# Altium schematic symbol library TI Amplifiers and Linear Special Function Amplifier.SchLib: 708 symbols (part 11 of 34)
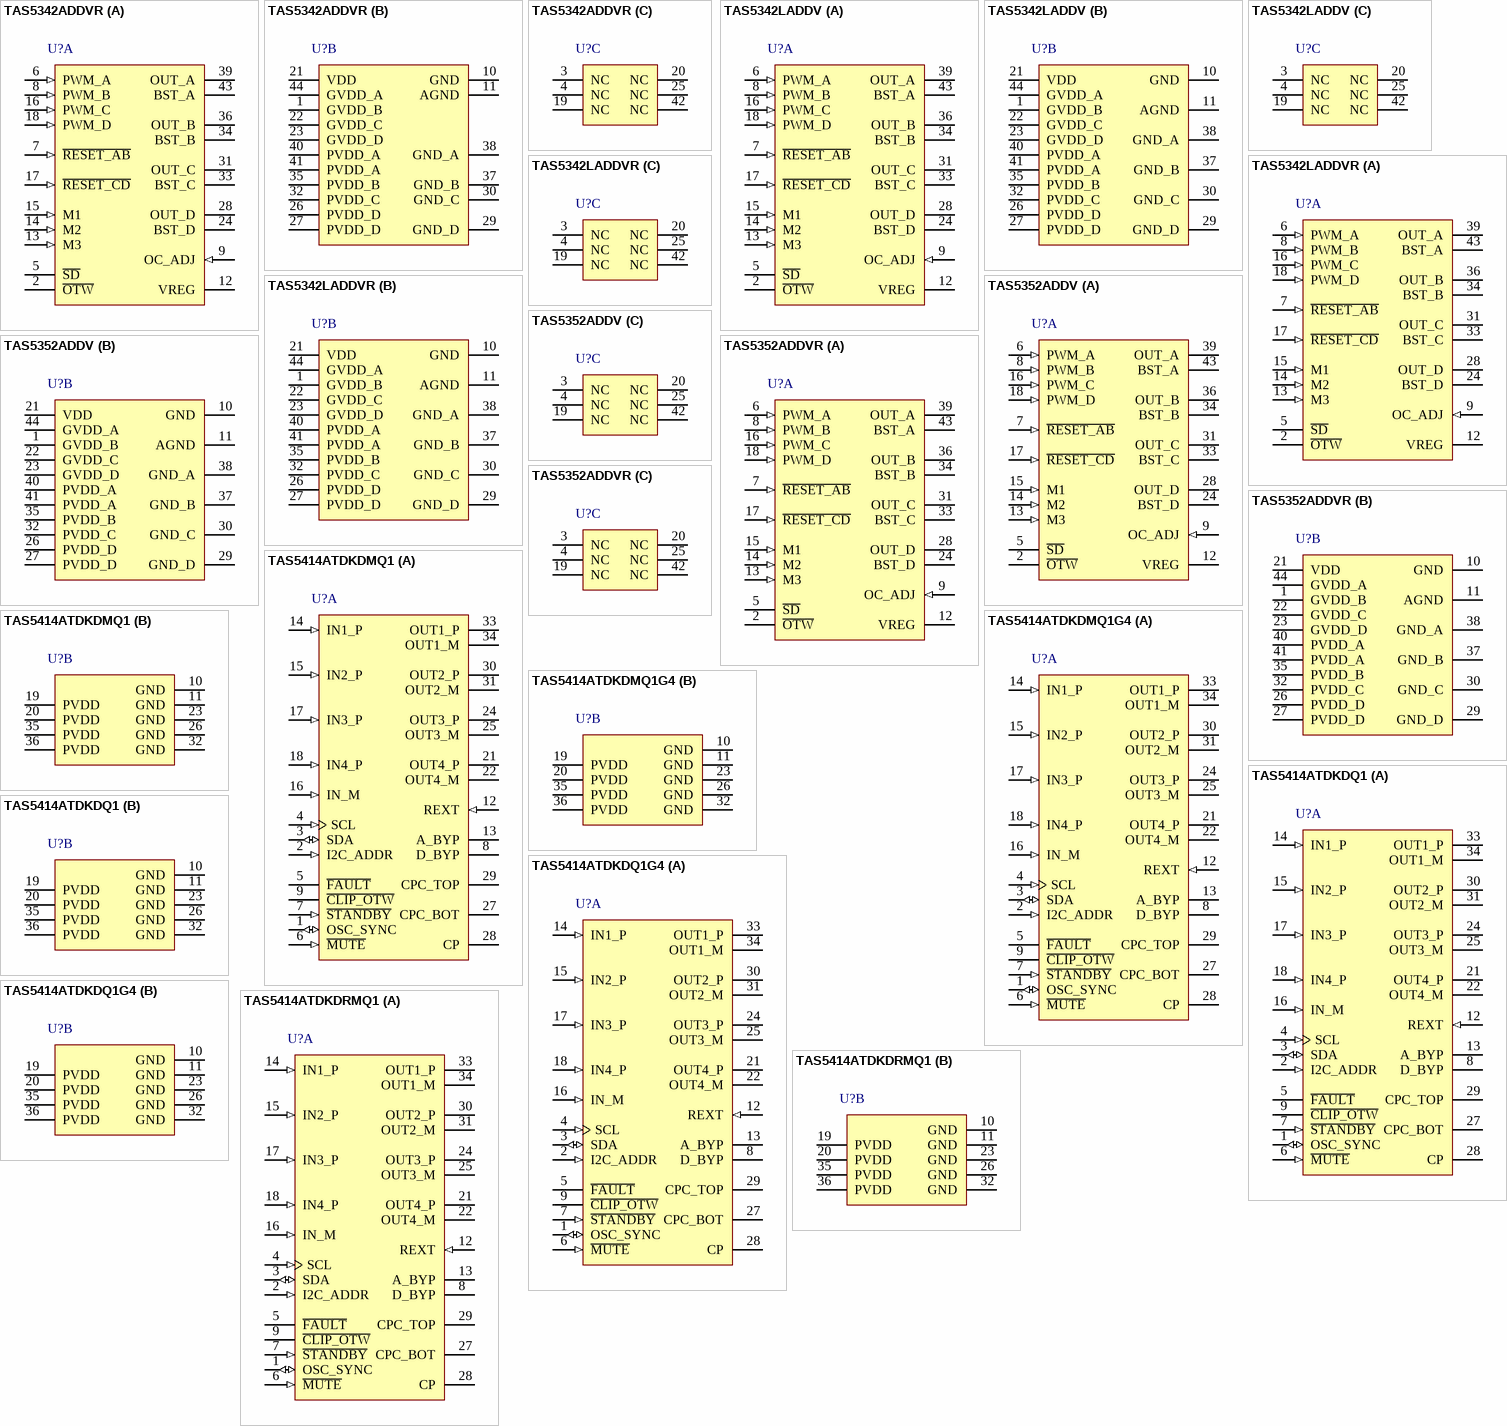
[diagram p49: symbols TAS5342ADDVR to TAS5414ATDKDRMQ1]

## TAS5414ATDKDMQ1
designator U?
4-Channel Automotive Digital Amplifier, -40 to 105 degC, 36-pin SOP (DKD36), Green (RoHS & no Sb/Br); Manufacturer: Texas Instruments; PartNumber: TAS5414ATDKDMQ1; Analog Supply Max [V]: 26.5; Analog Supply Min [V]: 6; Input Type: Analog; Max. Number of Speaker Outputs: 4; SubFamily: Mid/High-Power Amplifier; DatasheetVersion: SLOS535C; PackageVersion: 4204421-2/K, 06/2012; PackageReference: DKD36; PackageDescription: 36-Pin Plastic Small Outline, Body 15.9 x 11 mm, Pitch 0.65 mm; Supplier 1: Digi-Key; Supplier Part Number 1: 296-22042-5-ND; Supplier 2: Newark; Supplier Part Number 2: 52M6048; Supplier 3: Mouser; Supplier Part Number 3: 595-TAS5414ATDKDMQ1; Eco-Plan: Green (RoHS & no Sb/Br); Power Stage Supply Min(V): 6; Mounting Technology: Surface Mount; ComponentLink1Description: Manufacturer URL; ComponentLink1URL: http://www.ti.com/; ComponentLink2Description: Datasheet; ComponentLink2URL: http://www.ti.com/general/docs/lit/getliterature.tsp?genericPartNumber=TAS5414A&fileType=pdf; ComponentLink3Description: Package Specification; ComponentLink3URL: http://www.ti.com/lit/ds/symlink/tas5121i.pdf
footprint TI-DKD36_N (SOP, 36-Leads, Body 16x11.1mm, Pitch 0.65mm, IPC Medium Density)
footprint TI-DKD36_L (SOP, 36-Leads, Body 16x11.1mm, Pitch 0.65mm, IPC High Density)
footprint TI-DKD36_M (SOP, 36-Leads, Body 16x11.1mm, Pitch 0.65mm, IPC Low Density)
part A pins: 1 OSC_SYNC (io) "Oscillator sync input from master or output to slave amplifiers (20 MHz divided by 5, 6, or 7)", 2 I2C_ADDR (in) "I2C address bit", 3 SDA (io) "I2C data I/O for communication with system I2C master", 4 SCL (in) "I2C clock input from system I2C master", 5 ~{FAULT} (oc) "Global fault output (open drain): UV, OV, OTSD, OCSD, DC", 6 ~{MUTE} (in) "Gain ramp control: mute (low), play (high)", 7 ~{STANDBY} (in) "Active-low STANDBY pin. Standby (low), power up (high)", 8 D_BYP "Bypass pin for DVDD regulator output", 9 ~{CLIP_OTW} (oc) "Open-drain CLIP, OTW, or logical OR of the CLIP and OTW outputs. It also reports tweeter detection during tweeter mode.", 12 REXT (in) "Precision resistor pin to set analog reference", 13 A_BYP "Bypass pin for the AVDD analog regulator", 14 IN1_P (in) "Non-inverting analog input for channel 1", 15 IN2_P (in) "Non-inverting analog input for channel 2", 16 IN_M (in) "Signal return for the 4 analog channel inputs (TAS5414A only)", 17 IN3_P (in) "Non-inverting analog input for channel 3", 18 IN4_P (in) "Non-inverting analog input for channel 4", 21 OUT4_P (hiz) "+ polarity output for bridge 4", 22 OUT4_M (hiz) "- polarity output for bridge 4", 24 OUT3_P (hiz) "+ polarity output for bridge 3", 25 OUT3_M (hiz) "- polarity output for bridge 3", 27 CPC_BOT "Bottom of flying capacitor for charge pump", 28 CP "Top of main storage capacitor for charge pump (bottom goes to PVDD)", 29 CPC_TOP "Top of flying capacitor for charge pump", 30 OUT2_P (hiz) "+ polarity output for bridge 2", 31 OUT2_M (hiz) "- polarity output for bridge 2", 33 OUT1_P (hiz) "+ polarity output for bridge 1", 34 OUT1_M (hiz) "- polarity output for bridge 1"
part B pins: 10 GND (power) "Ground", 11 GND (power) "Ground", 19 PVDD (power) "PVDD supply", 20 PVDD (power) "PVDD supply", 23 GND (power) "Ground", 26 GND (power) "Ground", 32 GND (power) "Ground", 35 PVDD (power) "PVDD supply", 36 PVDD (power) "PVDD supply"

## TAS5414ATDKDMQ1G4
designator U?
4-Channel Automotive Digital Amplifier, -40 to 105 degC, 36-pin SOP (DKD36), Green (RoHS & no Sb/Br); Manufacturer: Texas Instruments; PartNumber: TAS5414ATDKDMQ1G4; Analog Supply Max [V]: 26.5; Analog Supply Min [V]: 6; Input Type: Analog; Max. Number of Speaker Outputs: 4; SubFamily: Mid/High-Power Amplifier; DatasheetVersion: SLOS535C; PackageVersion: 4204421-2/K, 06/2012; PackageReference: DKD36; PackageDescription: 36-Pin Plastic Small Outline, Body 15.9 x 11 mm, Pitch 0.65 mm; Supplier 1: Digi-Key; Supplier Part Number 1: TAS5414ATDKDMQ1G4-ND; Supplier 2: Mouser; Supplier Part Number 2: 595-TA5414ATDKDMQ1G4; Eco-Plan: Green (RoHS & no Sb/Br); Power Stage Supply Min(V): 6; Mounting Technology: Surface Mount; ComponentLink1Description: Manufacturer URL; ComponentLink1URL: http://www.ti.com/; ComponentLink2Description: Datasheet; ComponentLink2URL: http://www.ti.com/general/docs/lit/getliterature.tsp?genericPartNumber=TAS5414A&fileType=pdf; ComponentLink3Description: Package Specification; ComponentLink3URL: http://www.ti.com/lit/ds/symlink/tas5121i.pdf
footprint TI-DKD36_N (SOP, 36-Leads, Body 16x11.1mm, Pitch 0.65mm, IPC Medium Density)
footprint TI-DKD36_L (SOP, 36-Leads, Body 16x11.1mm, Pitch 0.65mm, IPC High Density)
footprint TI-DKD36_M (SOP, 36-Leads, Body 16x11.1mm, Pitch 0.65mm, IPC Low Density)
part A pins: 1 OSC_SYNC (io) "Oscillator sync input from master or output to slave amplifiers (20 MHz divided by 5, 6, or 7)", 2 I2C_ADDR (in) "I2C address bit", 3 SDA (io) "I2C data I/O for communication with system I2C master", 4 SCL (in) "I2C clock input from system I2C master", 5 ~{FAULT} (oc) "Global fault output (open drain): UV, OV, OTSD, OCSD, DC", 6 ~{MUTE} (in) "Gain ramp control: mute (low), play (high)", 7 ~{STANDBY} (in) "Active-low STANDBY pin. Standby (low), power up (high)", 8 D_BYP "Bypass pin for DVDD regulator output", 9 ~{CLIP_OTW} (oc) "Open-drain CLIP, OTW, or logical OR of the CLIP and OTW outputs. It also reports tweeter detection during tweeter mode.", 12 REXT (in) "Precision resistor pin to set analog reference", 13 A_BYP "Bypass pin for the AVDD analog regulator", 14 IN1_P (in) "Non-inverting analog input for channel 1", 15 IN2_P (in) "Non-inverting analog input for channel 2", 16 IN_M (in) "Signal return for the 4 analog channel inputs (TAS5414A only)", 17 IN3_P (in) "Non-inverting analog input for channel 3", 18 IN4_P (in) "Non-inverting analog input for channel 4", 21 OUT4_P (hiz) "+ polarity output for bridge 4", 22 OUT4_M (hiz) "- polarity output for bridge 4", 24 OUT3_P (hiz) "+ polarity output for bridge 3", 25 OUT3_M (hiz) "- polarity output for bridge 3", 27 CPC_BOT "Bottom of flying capacitor for charge pump", 28 CP "Top of main storage capacitor for charge pump (bottom goes to PVDD)", 29 CPC_TOP "Top of flying capacitor for charge pump", 30 OUT2_P (hiz) "+ polarity output for bridge 2", 31 OUT2_M (hiz) "- polarity output for bridge 2", 33 OUT1_P (hiz) "+ polarity output for bridge 1", 34 OUT1_M (hiz) "- polarity output for bridge 1"
part B pins: 10 GND (power) "Ground", 11 GND (power) "Ground", 19 PVDD (power) "PVDD supply", 20 PVDD (power) "PVDD supply", 23 GND (power) "Ground", 26 GND (power) "Ground", 32 GND (power) "Ground", 35 PVDD (power) "PVDD supply", 36 PVDD (power) "PVDD supply"

## TAS5414ATDKDQ1
designator U?
4-Channel Automotive Digital Amplifier, -40 to 105 degC, 36-pin SOP (DKD36), Green (RoHS & no Sb/Br); Manufacturer: Texas Instruments; PartNumber: TAS5414ATDKDQ1; Analog Supply Max [V]: 26.5; Analog Supply Min [V]: 6; Input Type: Analog; Max. Number of Speaker Outputs: 4; SubFamily: Mid/High-Power Amplifier; DatasheetVersion: SLOS535C; PackageVersion: 4204421-2/K, 06/2012; PackageReference: DKD36; PackageDescription: 36-Pin Plastic Small Outline, Body 15.9 x 11 mm, Pitch 0.65 mm; Supplier 1: Digi-Key; Supplier Part Number 1: 296-22674-5-ND; Supplier 2: Mouser; Supplier Part Number 2: 595-TAS5414ATDKDQ1; Eco-Plan: Green (RoHS & no Sb/Br); Power Stage Supply Min(V): 6; Mounting Technology: Surface Mount; ComponentLink1Description: Manufacturer URL; ComponentLink1URL: http://www.ti.com/; ComponentLink2Description: Datasheet; ComponentLink2URL: http://www.ti.com/general/docs/lit/getliterature.tsp?genericPartNumber=TAS5414A&fileType=pdf; ComponentLink3Description: Package Specification; ComponentLink3URL: http://www.ti.com/lit/ds/symlink/tas5121i.pdf
footprint TI-DKD36_N (SOP, 36-Leads, Body 16x11.1mm, Pitch 0.65mm, IPC Medium Density)
footprint TI-DKD36_L (SOP, 36-Leads, Body 16x11.1mm, Pitch 0.65mm, IPC High Density)
footprint TI-DKD36_M (SOP, 36-Leads, Body 16x11.1mm, Pitch 0.65mm, IPC Low Density)
part A pins: 1 OSC_SYNC (io) "Oscillator sync input from master or output to slave amplifiers (20 MHz divided by 5, 6, or 7)", 2 I2C_ADDR (in) "I2C address bit", 3 SDA (io) "I2C data I/O for communication with system I2C master", 4 SCL (in) "I2C clock input from system I2C master", 5 ~{FAULT} (oc) "Global fault output (open drain): UV, OV, OTSD, OCSD, DC", 6 ~{MUTE} (in) "Gain ramp control: mute (low), play (high)", 7 ~{STANDBY} (in) "Active-low STANDBY pin. Standby (low), power up (high)", 8 D_BYP "Bypass pin for DVDD regulator output", 9 ~{CLIP_OTW} (oc) "Open-drain CLIP, OTW, or logical OR of the CLIP and OTW outputs. It also reports tweeter detection during tweeter mode.", 12 REXT (in) "Precision resistor pin to set analog reference", 13 A_BYP "Bypass pin for the AVDD analog regulator", 14 IN1_P (in) "Non-inverting analog input for channel 1", 15 IN2_P (in) "Non-inverting analog input for channel 2", 16 IN_M (in) "Signal return for the 4 analog channel inputs (TAS5414A only)", 17 IN3_P (in) "Non-inverting analog input for channel 3", 18 IN4_P (in) "Non-inverting analog input for channel 4", 21 OUT4_P (hiz) "+ polarity output for bridge 4", 22 OUT4_M (hiz) "- polarity output for bridge 4", 24 OUT3_P (hiz) "+ polarity output for bridge 3", 25 OUT3_M (hiz) "- polarity output for bridge 3", 27 CPC_BOT "Bottom of flying capacitor for charge pump", 28 CP "Top of main storage capacitor for charge pump (bottom goes to PVDD)", 29 CPC_TOP "Top of flying capacitor for charge pump", 30 OUT2_P (hiz) "+ polarity output for bridge 2", 31 OUT2_M (hiz) "- polarity output for bridge 2", 33 OUT1_P (hiz) "+ polarity output for bridge 1", 34 OUT1_M (hiz) "- polarity output for bridge 1"
part B pins: 10 GND (power) "Ground", 11 GND (power) "Ground", 19 PVDD (power) "PVDD supply", 20 PVDD (power) "PVDD supply", 23 GND (power) "Ground", 26 GND (power) "Ground", 32 GND (power) "Ground", 35 PVDD (power) "PVDD supply", 36 PVDD (power) "PVDD supply"

## TAS5414ATDKDQ1G4
designator U?
4-Channel Automotive Digital Amplifier, -40 to 105 degC, 36-pin SOP (DKD36), Green (RoHS & no Sb/Br); Manufacturer: Texas Instruments; PartNumber: TAS5414ATDKDQ1G4; Analog Supply Max [V]: 26.5; Analog Supply Min [V]: 6; Input Type: Analog; Max. Number of Speaker Outputs: 4; SubFamily: Mid/High-Power Amplifier; DatasheetVersion: SLOS535C; PackageVersion: 4204421-2/K, 06/2012; PackageReference: DKD36; PackageDescription: 36-Pin Plastic Small Outline, Body 15.9 x 11 mm, Pitch 0.65 mm; Supplier 1: Digi-Key; Supplier Part Number 1: TAS5414ATDKDQ1G4-ND; Supplier 2: Mouser; Supplier Part Number 2: 595-TAS5414ATDKDQ1G4; Eco-Plan: Green (RoHS & no Sb/Br); Power Stage Supply Min(V): 6; Mounting Technology: Surface Mount; ComponentLink1Description: Manufacturer URL; ComponentLink1URL: http://www.ti.com/; ComponentLink2Description: Datasheet; ComponentLink2URL: http://www.ti.com/general/docs/lit/getliterature.tsp?genericPartNumber=TAS5414A&fileType=pdf; ComponentLink3Description: Package Specification; ComponentLink3URL: http://www.ti.com/lit/ds/symlink/tas5121i.pdf
footprint TI-DKD36_N (SOP, 36-Leads, Body 16x11.1mm, Pitch 0.65mm, IPC Medium Density)
footprint TI-DKD36_L (SOP, 36-Leads, Body 16x11.1mm, Pitch 0.65mm, IPC High Density)
footprint TI-DKD36_M (SOP, 36-Leads, Body 16x11.1mm, Pitch 0.65mm, IPC Low Density)
part A pins: 1 OSC_SYNC (io) "Oscillator sync input from master or output to slave amplifiers (20 MHz divided by 5, 6, or 7)", 2 I2C_ADDR (in) "I2C address bit", 3 SDA (io) "I2C data I/O for communication with system I2C master", 4 SCL (in) "I2C clock input from system I2C master", 5 ~{FAULT} (oc) "Global fault output (open drain): UV, OV, OTSD, OCSD, DC", 6 ~{MUTE} (in) "Gain ramp control: mute (low), play (high)", 7 ~{STANDBY} (in) "Active-low STANDBY pin. Standby (low), power up (high)", 8 D_BYP "Bypass pin for DVDD regulator output", 9 ~{CLIP_OTW} (oc) "Open-drain CLIP, OTW, or logical OR of the CLIP and OTW outputs. It also reports tweeter detection during tweeter mode.", 12 REXT (in) "Precision resistor pin to set analog reference", 13 A_BYP "Bypass pin for the AVDD analog regulator", 14 IN1_P (in) "Non-inverting analog input for channel 1", 15 IN2_P (in) "Non-inverting analog input for channel 2", 16 IN_M (in) "Signal return for the 4 analog channel inputs (TAS5414A only)", 17 IN3_P (in) "Non-inverting analog input for channel 3", 18 IN4_P (in) "Non-inverting analog input for channel 4", 21 OUT4_P (hiz) "+ polarity output for bridge 4", 22 OUT4_M (hiz) "- polarity output for bridge 4", 24 OUT3_P (hiz) "+ polarity output for bridge 3", 25 OUT3_M (hiz) "- polarity output for bridge 3", 27 CPC_BOT "Bottom of flying capacitor for charge pump", 28 CP "Top of main storage capacitor for charge pump (bottom goes to PVDD)", 29 CPC_TOP "Top of flying capacitor for charge pump", 30 OUT2_P (hiz) "+ polarity output for bridge 2", 31 OUT2_M (hiz) "- polarity output for bridge 2", 33 OUT1_P (hiz) "+ polarity output for bridge 1", 34 OUT1_M (hiz) "- polarity output for bridge 1"
part B pins: 10 GND (power) "Ground", 11 GND (power) "Ground", 19 PVDD (power) "PVDD supply", 20 PVDD (power) "PVDD supply", 23 GND (power) "Ground", 26 GND (power) "Ground", 32 GND (power) "Ground", 35 PVDD (power) "PVDD supply", 36 PVDD (power) "PVDD supply"

## TAS5414ATDKDRMQ1
designator U?
4-Channel Automotive Digital Amplifier, -40 to 105 degC, 36-pin SOP (DKD36), Green (RoHS & no Sb/Br); Manufacturer: Texas Instruments; PartNumber: TAS5414ATDKDRMQ1; Analog Supply Max [V]: 26.5; Analog Supply Min [V]: 6; Input Type: Analog; Max. Number of Speaker Outputs: 4; SubFamily: Mid/High-Power Amplifier; DatasheetVersion: SLOS535C; PackageVersion: 4204421-2/K, 06/2012; PackageReference: DKD36; PackageDescription: 36-Pin Plastic Small Outline, Body 15.9 x 11 mm, Pitch 0.65 mm; Supplier 1: Digi-Key; Supplier Part Number 1: TAS5414ATDKDRMQ1-ND; Supplier 2: Mouser; Supplier Part Number 2: 595-TAS5414ATDKDRMQ1; Eco-Plan: Green (RoHS & no Sb/Br); Power Stage Supply Min(V): 6; Mounting Technology: Surface Mount; ComponentLink1Description: Manufacturer URL; ComponentLink1URL: http://www.ti.com/; ComponentLink2Description: Datasheet; ComponentLink2URL: http://www.ti.com/general/docs/lit/getliterature.tsp?genericPartNumber=TAS5414A&fileType=pdf; ComponentLink3Description: Package Specification; ComponentLink3URL: http://www.ti.com/lit/ds/symlink/tas5121i.pdf
footprint TI-DKD36_N (SOP, 36-Leads, Body 16x11.1mm, Pitch 0.65mm, IPC Medium Density)
footprint TI-DKD36_L (SOP, 36-Leads, Body 16x11.1mm, Pitch 0.65mm, IPC High Density)
footprint TI-DKD36_M (SOP, 36-Leads, Body 16x11.1mm, Pitch 0.65mm, IPC Low Density)
part A pins: 1 OSC_SYNC (io) "Oscillator sync input from master or output to slave amplifiers (20 MHz divided by 5, 6, or 7)", 2 I2C_ADDR (in) "I2C address bit", 3 SDA (io) "I2C data I/O for communication with system I2C master", 4 SCL (in) "I2C clock input from system I2C master", 5 ~{FAULT} (oc) "Global fault output (open drain): UV, OV, OTSD, OCSD, DC", 6 ~{MUTE} (in) "Gain ramp control: mute (low), play (high)", 7 ~{STANDBY} (in) "Active-low STANDBY pin. Standby (low), power up (high)", 8 D_BYP "Bypass pin for DVDD regulator output", 9 ~{CLIP_OTW} (oc) "Open-drain CLIP, OTW, or logical OR of the CLIP and OTW outputs. It also reports tweeter detection during tweeter mode.", 12 REXT (in) "Precision resistor pin to set analog reference", 13 A_BYP "Bypass pin for the AVDD analog regulator", 14 IN1_P (in) "Non-inverting analog input for channel 1", 15 IN2_P (in) "Non-inverting analog input for channel 2", 16 IN_M (in) "Signal return for the 4 analog channel inputs (TAS5414A only)", 17 IN3_P (in) "Non-inverting analog input for channel 3", 18 IN4_P (in) "Non-inverting analog input for channel 4", 21 OUT4_P (hiz) "+ polarity output for bridge 4", 22 OUT4_M (hiz) "- polarity output for bridge 4", 24 OUT3_P (hiz) "+ polarity output for bridge 3", 25 OUT3_M (hiz) "- polarity output for bridge 3", 27 CPC_BOT "Bottom of flying capacitor for charge pump", 28 CP "Top of main storage capacitor for charge pump (bottom goes to PVDD)", 29 CPC_TOP "Top of flying capacitor for charge pump", 30 OUT2_P (hiz) "+ polarity output for bridge 2", 31 OUT2_M (hiz) "- polarity output for bridge 2", 33 OUT1_P (hiz) "+ polarity output for bridge 1", 34 OUT1_M (hiz) "- polarity output for bridge 1"
part B pins: 10 GND (power) "Ground", 11 GND (power) "Ground", 19 PVDD (power) "PVDD supply", 20 PVDD (power) "PVDD supply", 23 GND (power) "Ground", 26 GND (power) "Ground", 32 GND (power) "Ground", 35 PVDD (power) "PVDD supply", 36 PVDD (power) "PVDD supply"

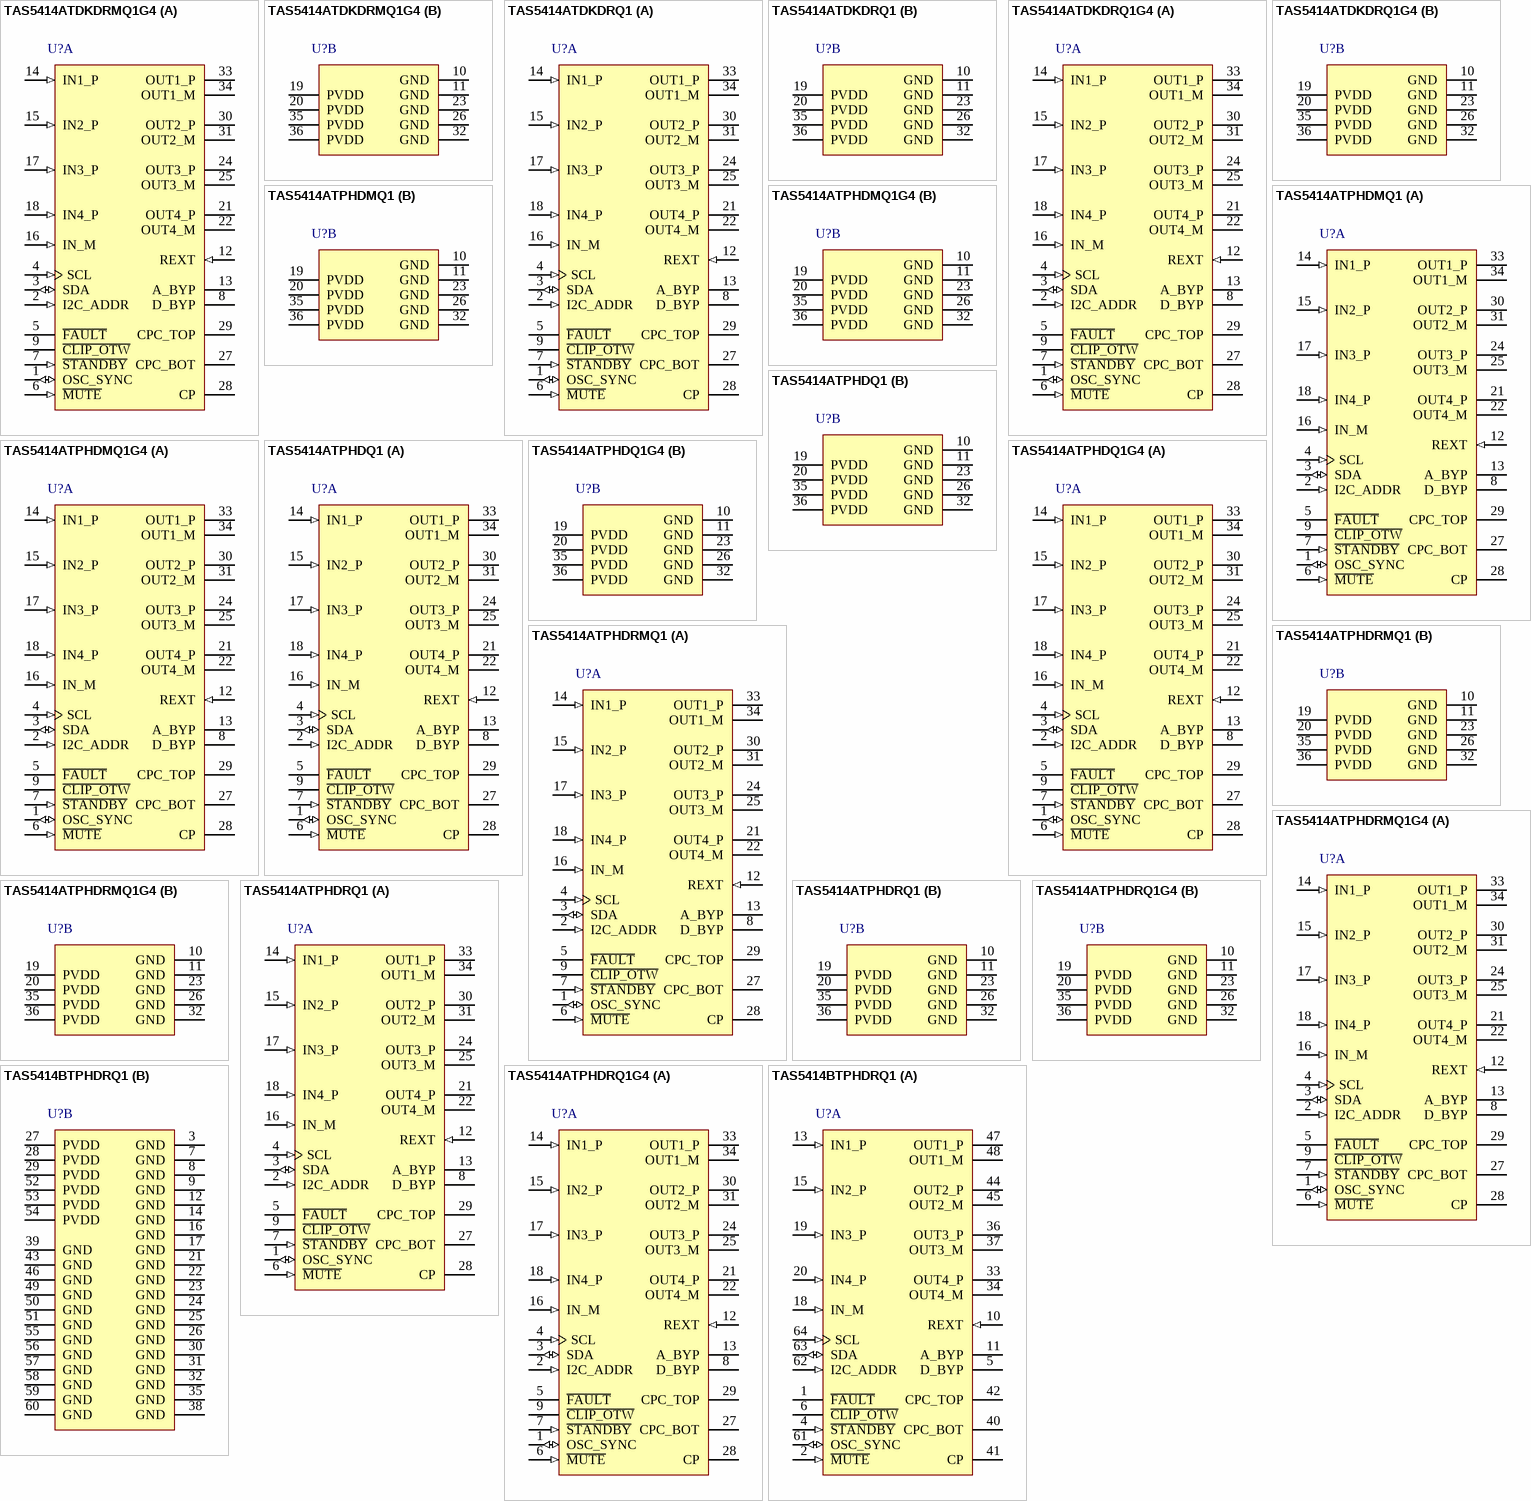
[diagram p14: symbols TAS5414ATDKDRMQ1G4 to TAS5414BTPHDRQ1]

## TAS5414ATDKDRMQ1G4
designator U?
4-Channel Automotive Digital Amplifier, -40 to 105 degC, 36-pin SOP (DKD36), Green (RoHS & no Sb/Br); Manufacturer: Texas Instruments; PartNumber: TAS5414ATDKDRMQ1G4; Analog Supply Max [V]: 26.5; Analog Supply Min [V]: 6; Input Type: Analog; Max. Number of Speaker Outputs: 4; SubFamily: Mid/High-Power Amplifier; DatasheetVersion: SLOS535C; PackageVersion: 4204421-2/K, 06/2012; PackageReference: DKD36; PackageDescription: 36-Pin Plastic Small Outline, Body 15.9 x 11 mm, Pitch 0.65 mm; Supplier 1: Digi-Key; Supplier Part Number 1: TAS5414ATDKDRMQ1G4-ND; Supplier 2: Mouser; Supplier Part Number 2: 595-T5414ATDKDRMQ1G4; Eco-Plan: Green (RoHS & no Sb/Br); Power Stage Supply Min(V): 6; Mounting Technology: Surface Mount; ComponentLink1Description: Manufacturer URL; ComponentLink1URL: http://www.ti.com/; ComponentLink2Description: Datasheet; ComponentLink2URL: http://www.ti.com/general/docs/lit/getliterature.tsp?genericPartNumber=TAS5414A&fileType=pdf; ComponentLink3Description: Package Specification; ComponentLink3URL: http://www.ti.com/lit/ds/symlink/tas5121i.pdf
footprint TI-DKD36_N (SOP, 36-Leads, Body 16x11.1mm, Pitch 0.65mm, IPC Medium Density)
footprint TI-DKD36_L (SOP, 36-Leads, Body 16x11.1mm, Pitch 0.65mm, IPC High Density)
footprint TI-DKD36_M (SOP, 36-Leads, Body 16x11.1mm, Pitch 0.65mm, IPC Low Density)
part A pins: 1 OSC_SYNC (io) "Oscillator sync input from master or output to slave amplifiers (20 MHz divided by 5, 6, or 7)", 2 I2C_ADDR (in) "I2C address bit", 3 SDA (io) "I2C data I/O for communication with system I2C master", 4 SCL (in) "I2C clock input from system I2C master", 5 ~{FAULT} (oc) "Global fault output (open drain): UV, OV, OTSD, OCSD, DC", 6 ~{MUTE} (in) "Gain ramp control: mute (low), play (high)", 7 ~{STANDBY} (in) "Active-low STANDBY pin. Standby (low), power up (high)", 8 D_BYP "Bypass pin for DVDD regulator output", 9 ~{CLIP_OTW} (oc) "Open-drain CLIP, OTW, or logical OR of the CLIP and OTW outputs. It also reports tweeter detection during tweeter mode.", 12 REXT (in) "Precision resistor pin to set analog reference", 13 A_BYP "Bypass pin for the AVDD analog regulator", 14 IN1_P (in) "Non-inverting analog input for channel 1", 15 IN2_P (in) "Non-inverting analog input for channel 2", 16 IN_M (in) "Signal return for the 4 analog channel inputs (TAS5414A only)", 17 IN3_P (in) "Non-inverting analog input for channel 3", 18 IN4_P (in) "Non-inverting analog input for channel 4", 21 OUT4_P (hiz) "+ polarity output for bridge 4", 22 OUT4_M (hiz) "- polarity output for bridge 4", 24 OUT3_P (hiz) "+ polarity output for bridge 3", 25 OUT3_M (hiz) "- polarity output for bridge 3", 27 CPC_BOT "Bottom of flying capacitor for charge pump", 28 CP "Top of main storage capacitor for charge pump (bottom goes to PVDD)", 29 CPC_TOP "Top of flying capacitor for charge pump", 30 OUT2_P (hiz) "+ polarity output for bridge 2", 31 OUT2_M (hiz) "- polarity output for bridge 2", 33 OUT1_P (hiz) "+ polarity output for bridge 1", 34 OUT1_M (hiz) "- polarity output for bridge 1"
part B pins: 10 GND (power) "Ground", 11 GND (power) "Ground", 19 PVDD (power) "PVDD supply", 20 PVDD (power) "PVDD supply", 23 GND (power) "Ground", 26 GND (power) "Ground", 32 GND (power) "Ground", 35 PVDD (power) "PVDD supply", 36 PVDD (power) "PVDD supply"

## TAS5414ATDKDRQ1
designator U?
4-Channel Automotive Digital Amplifier, -40 to 105 degC, 36-pin SOP (DKD36), Green (RoHS & no Sb/Br); Manufacturer: Texas Instruments; PartNumber: TAS5414ATDKDRQ1; Analog Supply Max [V]: 26.5; Analog Supply Min [V]: 6; Input Type: Analog; Max. Number of Speaker Outputs: 4; SubFamily: Mid/High-Power Amplifier; DatasheetVersion: SLOS535C; PackageVersion: 4204421-2/K, 06/2012; PackageReference: DKD36; PackageDescription: 36-Pin Plastic Small Outline, Body 15.9 x 11 mm, Pitch 0.65 mm; Supplier 1: Digi-Key; Supplier Part Number 1: TAS5414ATDKDRQ1-ND; Supplier 2: Mouser; Supplier Part Number 2: 595-TAS5414ATDKDRQ1; Eco-Plan: Green (RoHS & no Sb/Br); Power Stage Supply Min(V): 6; Mounting Technology: Surface Mount; ComponentLink1Description: Manufacturer URL; ComponentLink1URL: http://www.ti.com/; ComponentLink2Description: Datasheet; ComponentLink2URL: http://www.ti.com/general/docs/lit/getliterature.tsp?genericPartNumber=TAS5414A&fileType=pdf; ComponentLink3Description: Package Specification; ComponentLink3URL: http://www.ti.com/lit/ds/symlink/tas5121i.pdf
footprint TI-DKD36_N (SOP, 36-Leads, Body 16x11.1mm, Pitch 0.65mm, IPC Medium Density)
footprint TI-DKD36_L (SOP, 36-Leads, Body 16x11.1mm, Pitch 0.65mm, IPC High Density)
footprint TI-DKD36_M (SOP, 36-Leads, Body 16x11.1mm, Pitch 0.65mm, IPC Low Density)
part A pins: 1 OSC_SYNC (io) "Oscillator sync input from master or output to slave amplifiers (20 MHz divided by 5, 6, or 7)", 2 I2C_ADDR (in) "I2C address bit", 3 SDA (io) "I2C data I/O for communication with system I2C master", 4 SCL (in) "I2C clock input from system I2C master", 5 ~{FAULT} (oc) "Global fault output (open drain): UV, OV, OTSD, OCSD, DC", 6 ~{MUTE} (in) "Gain ramp control: mute (low), play (high)", 7 ~{STANDBY} (in) "Active-low STANDBY pin. Standby (low), power up (high)", 8 D_BYP "Bypass pin for DVDD regulator output", 9 ~{CLIP_OTW} (oc) "Open-drain CLIP, OTW, or logical OR of the CLIP and OTW outputs. It also reports tweeter detection during tweeter mode.", 12 REXT (in) "Precision resistor pin to set analog reference", 13 A_BYP "Bypass pin for the AVDD analog regulator", 14 IN1_P (in) "Non-inverting analog input for channel 1", 15 IN2_P (in) "Non-inverting analog input for channel 2", 16 IN_M (in) "Signal return for the 4 analog channel inputs (TAS5414A only)", 17 IN3_P (in) "Non-inverting analog input for channel 3", 18 IN4_P (in) "Non-inverting analog input for channel 4", 21 OUT4_P (hiz) "+ polarity output for bridge 4", 22 OUT4_M (hiz) "- polarity output for bridge 4", 24 OUT3_P (hiz) "+ polarity output for bridge 3", 25 OUT3_M (hiz) "- polarity output for bridge 3", 27 CPC_BOT "Bottom of flying capacitor for charge pump", 28 CP "Top of main storage capacitor for charge pump (bottom goes to PVDD)", 29 CPC_TOP "Top of flying capacitor for charge pump", 30 OUT2_P (hiz) "+ polarity output for bridge 2", 31 OUT2_M (hiz) "- polarity output for bridge 2", 33 OUT1_P (hiz) "+ polarity output for bridge 1", 34 OUT1_M (hiz) "- polarity output for bridge 1"
part B pins: 10 GND (power) "Ground", 11 GND (power) "Ground", 19 PVDD (power) "PVDD supply", 20 PVDD (power) "PVDD supply", 23 GND (power) "Ground", 26 GND (power) "Ground", 32 GND (power) "Ground", 35 PVDD (power) "PVDD supply", 36 PVDD (power) "PVDD supply"

## TAS5414ATDKDRQ1G4
designator U?
4-Channel Automotive Digital Amplifier, -40 to 105 degC, 36-pin SOP (DKD36), Green (RoHS & no Sb/Br); Manufacturer: Texas Instruments; PartNumber: TAS5414ATDKDRQ1G4; Analog Supply Max [V]: 26.5; Analog Supply Min [V]: 6; Input Type: Analog; Max. Number of Speaker Outputs: 4; SubFamily: Mid/High-Power Amplifier; DatasheetVersion: SLOS535C; PackageVersion: 4204421-2/K, 06/2012; PackageReference: DKD36; PackageDescription: 36-Pin Plastic Small Outline, Body 15.9 x 11 mm, Pitch 0.65 mm; Supplier 1: Digi-Key; Supplier Part Number 1: TAS5414ATDKDRQ1G4-ND; Supplier 2: Mouser; Supplier Part Number 2: 595-TA5414ATDKDRQ1G4; Eco-Plan: Green (RoHS & no Sb/Br); Power Stage Supply Min(V): 6; Mounting Technology: Surface Mount; ComponentLink1Description: Manufacturer URL; ComponentLink1URL: http://www.ti.com/; ComponentLink2Description: Datasheet; ComponentLink2URL: http://www.ti.com/general/docs/lit/getliterature.tsp?genericPartNumber=TAS5414A&fileType=pdf; ComponentLink3Description: Package Specification; ComponentLink3URL: http://www.ti.com/lit/ds/symlink/tas5121i.pdf
footprint TI-DKD36_N (SOP, 36-Leads, Body 16x11.1mm, Pitch 0.65mm, IPC Medium Density)
footprint TI-DKD36_L (SOP, 36-Leads, Body 16x11.1mm, Pitch 0.65mm, IPC High Density)
footprint TI-DKD36_M (SOP, 36-Leads, Body 16x11.1mm, Pitch 0.65mm, IPC Low Density)
part A pins: 1 OSC_SYNC (io) "Oscillator sync input from master or output to slave amplifiers (20 MHz divided by 5, 6, or 7)", 2 I2C_ADDR (in) "I2C address bit", 3 SDA (io) "I2C data I/O for communication with system I2C master", 4 SCL (in) "I2C clock input from system I2C master", 5 ~{FAULT} (oc) "Global fault output (open drain): UV, OV, OTSD, OCSD, DC", 6 ~{MUTE} (in) "Gain ramp control: mute (low), play (high)", 7 ~{STANDBY} (in) "Active-low STANDBY pin. Standby (low), power up (high)", 8 D_BYP "Bypass pin for DVDD regulator output", 9 ~{CLIP_OTW} (oc) "Open-drain CLIP, OTW, or logical OR of the CLIP and OTW outputs. It also reports tweeter detection during tweeter mode.", 12 REXT (in) "Precision resistor pin to set analog reference", 13 A_BYP "Bypass pin for the AVDD analog regulator", 14 IN1_P (in) "Non-inverting analog input for channel 1", 15 IN2_P (in) "Non-inverting analog input for channel 2", 16 IN_M (in) "Signal return for the 4 analog channel inputs (TAS5414A only)", 17 IN3_P (in) "Non-inverting analog input for channel 3", 18 IN4_P (in) "Non-inverting analog input for channel 4", 21 OUT4_P (hiz) "+ polarity output for bridge 4", 22 OUT4_M (hiz) "- polarity output for bridge 4", 24 OUT3_P (hiz) "+ polarity output for bridge 3", 25 OUT3_M (hiz) "- polarity output for bridge 3", 27 CPC_BOT "Bottom of flying capacitor for charge pump", 28 CP "Top of main storage capacitor for charge pump (bottom goes to PVDD)", 29 CPC_TOP "Top of flying capacitor for charge pump", 30 OUT2_P (hiz) "+ polarity output for bridge 2", 31 OUT2_M (hiz) "- polarity output for bridge 2", 33 OUT1_P (hiz) "+ polarity output for bridge 1", 34 OUT1_M (hiz) "- polarity output for bridge 1"
part B pins: 10 GND (power) "Ground", 11 GND (power) "Ground", 19 PVDD (power) "PVDD supply", 20 PVDD (power) "PVDD supply", 23 GND (power) "Ground", 26 GND (power) "Ground", 32 GND (power) "Ground", 35 PVDD (power) "PVDD supply", 36 PVDD (power) "PVDD supply"
